# Altium footprint library LDCN Components.PcbLib: 426 footprints (part 14 of 27)
Each footprint in its own frame and in the unit in brackets; x right, y up, seen from the top. Pads: shape width x height; smd on the part's side, far side on the other; paste and mask are expansions set on the pad; w line width, h text height; cw(c..) or ccw(c..) is an arc to the next point about the centre after c.
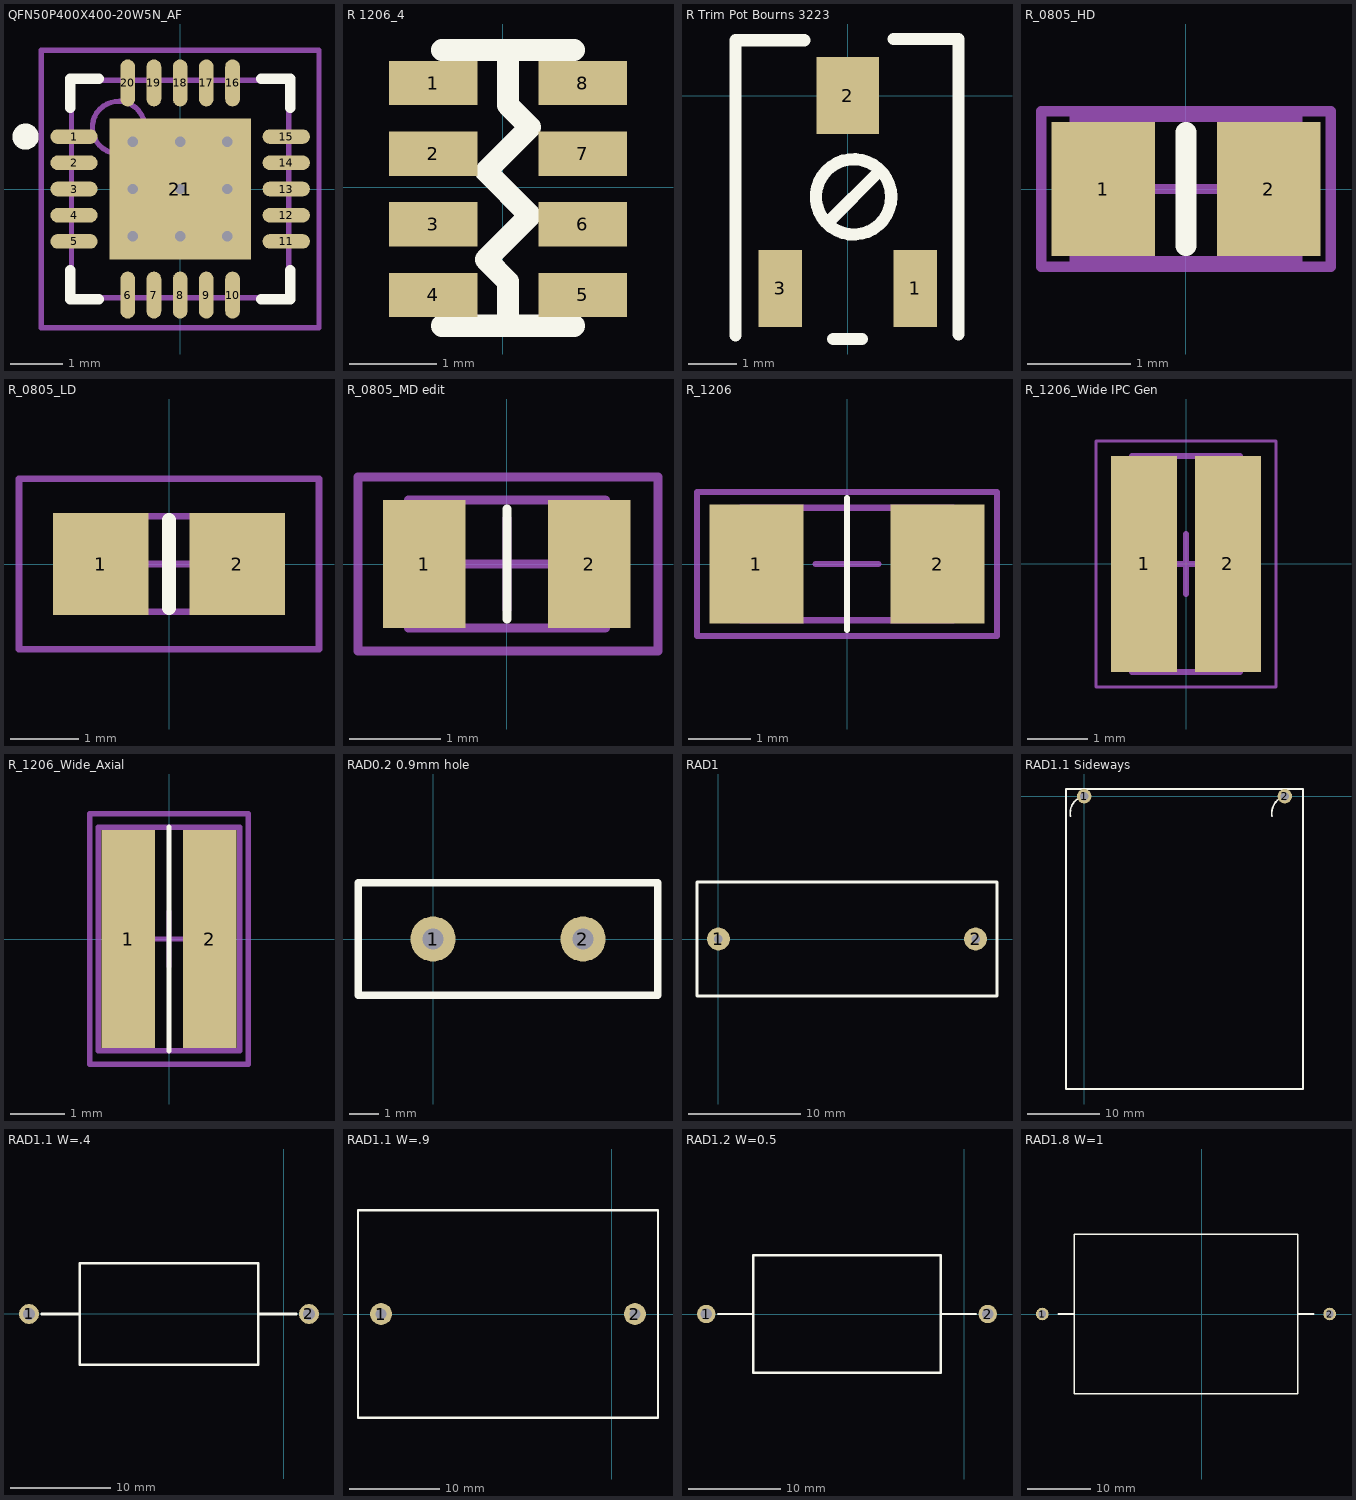
[diagram p13: the footprints below, top view; thin cyan lines are the x and y axes]

## QFN50P400X400-20W5N_AF [mm] "QFN, 20-Leads, Body 4x4mm, Pitch 0.5mm, IPC Medium Density"
height 0.8
pads (21):
  oval 0.9x0.28 smd: 1(-2.025,1) 2(-2.025,0.5) 3(-2.025,0) 4(-2.025,-0.5) 5(-2.025,-1) 11(2.025,-1) 12(2.025,-0.5) 13(2.025,0) 14(2.025,0.5) 15(2.025,1)
  oval 0.28x0.9 smd: 6(-1,-2.025) 7(-0.5,-2.025) 8(0,-2.025) 9(0.5,-2.025) 10(1,-2.025) 16(1,2.025) 17(0.5,2.025) 18(0,2.025) 19(-0.5,2.025) 20(-1,2.025)
  rect 2.7x2.7 smd: 21(0,0)
via -0.9,0.9 diameter 0.4 hole 0.2
via -0.9,0 diameter 0.4 hole 0.2
via -0.9,-0.9 diameter 0.4 hole 0.2
via 0,0.9 diameter 0.4 hole 0.2
via 0,0 diameter 0.4 hole 0.2
via 0,-0.9 diameter 0.4 hole 0.2
via 0.9,0.9 diameter 0.4 hole 0.2
via 0.9,0 diameter 0.4 hole 0.2
via 0.9,-0.9 diameter 0.4 hole 0.2
Top Overlay:
  circle w0.25: c-2.95,1 r0.125
  lines w0.2: -2.1,-1.55 -2.1,-2.1 -1.55,-2.1 ; -2.1,1.55 -2.1,2.1 -1.55,2.1 ; 1.55,-2.1 2.1,-2.1 2.1,-1.55 ; 1.55,2.1 2.1,2.1 2.1,1.55
Mechanical 13:
  circle w0.1: c-1.175,1.175 r0.5
  lines w0.1: -2.075,-2.075 2.075,-2.075 2.075,2.075 -2.075,2.075 -2.075,-2.075
Mechanical 15:
  lines w0.1: -0.5,0 0.5,0 ; 0,-0.5 0,0.5 ; -2.65,-2.65 2.65,-2.65 2.65,2.65 -2.65,2.65 -2.65,-2.65
3D body: height 0.8, standoff 0, extent -2.075,-2.075 2.075,2.075

## R 1206_4 [mil]
pads (8):
  rect 40x20 smd: 1(-31.5,47.24) 2(-31.5,15.24) 3(-31.5,-16.76) 4(-31.5,-48.76) 5(36.38,-48.76) 6(36.38,-16.76) 7(36.38,15.24) 8(36.38,47.24)
Top Overlay:
  lines w10: -27.56,-62.76 32.44,-62.76 ; -27.56,62.24 32.44,62.24 ; 2.44,-62.76 2.44,-42.76 -7.56,-32.76 12.44,-12.76 -7.56,7.24 12.44,27.24 2.44,37.24 2.44,62.24

## R Trim Pot Bourns 3223 [mm]
height 3.18
pads (3):
  rect 0.9x1.6 smd: 1(1.4,-4) 3(-1.4,-4)
  rect 1.3x1.6 smd: 2(0,0)
Top Overlay:
  circle w0.254: c0.125,-2.1 r0.781
  lines w0.254: -2.325,-4.975 -2.325,1.15 -0.9,1.15 ; -0.375,-2.6 0.625,-1.6 ; -0.3,-5.05 0.3,-5.05 ; 0.95,1.175 2.3,1.175 2.3,-4.95
3D body "3223G.stp": height 3.31, standoff 0.01, extent -1.95,-4.685 1.987,0.635

## R_0805_HD [mm] "Chip Resistor, Body 2.0x1.2mm, IPC High Density"
height 0.7
pads (2):
  rect 1x1.3 smd: 1(-0.8,0) 2(0.8,0)
Top Overlay:
  lines w0.2: 0,-0.55 0,0.55
Mechanical 13:
  lines w0.1: -1.075,-0.7 1.075,-0.7 1.075,0.7 -1.075,0.7 -1.075,-0.7
Mechanical 15:
  lines w0.1: -0.5,0 0.5,0 ; 0,-0.5 0,0.5 ; -1.4,-0.75 1.4,-0.75 1.4,0.75 -1.4,0.75 -1.4,-0.75
3D body: height 0.7, standoff 0, extent -1.075,-0.7 1.075,0.7

## R_0805_LD [mm] "Chip Resistor, Body 2.0x1.2mm, IPC Low Density"
height 0.7
pads (2):
  rect 1.4x1.5 smd: 1(-1,0) 2(1,0)
Top Overlay:
  lines w0.2: 0,-0.65 0,0.65
Mechanical 13:
  lines w0.1: -1.075,-0.7 -1.075,0.7 1.075,0.7 1.075,-0.7 -1.075,-0.7
Mechanical 15:
  lines w0.1: -0.5,0 0.5,0 ; 0,-0.5 0,0.5 ; -2.2,-1.25 -2.2,1.25 2.2,1.25 2.2,-1.25 -2.2,-1.25
3D body: height 0.7, standoff 0, extent -1.075,-0.7 1.075,0.7

## R_0805_MD edit [mm] "Chip Resistor, Body 2.0x1.2mm, IPC Medium Density"
height 0.7
pads (2):
  rect 0.9x1.4 smd: 1(-0.9,0) 2(0.9,0)
Top Overlay:
  lines w0.1: 0,-0.6 0,0.6
Mechanical 13:
  lines w0.1: -1.075,-0.7 -1.075,0.7 1.075,0.7 1.075,-0.7 -1.075,-0.7
Mechanical 15:
  lines w0.1: -0.5,0 0.5,0 ; 0,-0.5 0,0.5 ; -1.625,-0.95 -1.625,0.95 1.65,0.95 1.65,-0.95 -1.625,-0.95
3D body: height 0.7, standoff 0, extent -1.075,-0.7 1.075,0.7

## R_1206 [mm] "Chip Resistor, Body 3.2x1.6mm, IPC High Density"
height 0.65
pads (2):
  rect 1.5x1.9 smd: 1(-1.45,0) 2(1.45,0)
Top Overlay:
  lines w0.1: 0,-1.05 0,1.05
Mechanical 13:
  lines w0.1: -1.7,-0.9 1.7,-0.9 1.7,0.9 -1.7,0.9 -1.7,-0.9
Mechanical 15:
  lines w0.1: -0.5,0 0.5,0 ; 0,-0.5 0,0.5 ; -2.4,-1.15 2.4,-1.15 2.4,1.15 -2.4,1.15 -2.4,-1.15
3D body: height 1.3, standoff 0, extent -1.7,-0.9 1.7,0.9

## R_1206_Wide IPC Gen [mm] "Chip Resistor, 2-Leads, Body 1.60x3.30mm, IPC Medium Density"
height 0.6
pads (2):
  rect 1.1x3.6 smd: 1(-0.7,0) 2(0.7,0)
Mechanical 13:
  lines w0.1: -0.9,-1.8 -0.9,1.8 0.9,1.8 0.9,-1.8 -0.9,-1.8
Mechanical 15:
  lines w0.05: -1.5,-2.05 -1.5,2.05 1.5,2.05 1.5,-2.05 -1.5,-2.05
  lines w0.1: -0.5,0 0.5,0 ; 0,-0.5 0,0.5
3D body: height 0.6, standoff 0, extent -0.55,-1.8 0.55,1.8
3D body: height 0.6, standoff 0, extent -0.9,-1.8 -0.55,1.8
3D body: height 0.6, standoff 0, extent 0.55,-1.8 0.9,1.8

## R_1206_Wide_Axial [mm] "Wide 1206"
height 0.6
pads (2):
  rect 0.98x4 smd: 1(-0.75,0) 2(0.75,0)
Top Overlay:
  lines w0.1: 0,-2.05 0,2.05
Mechanical 13:
  lines w0.1: -1.3,-2.05 1.3,-2.05 1.3,-0.45 1.3,0.45 1.3,2.05 -1.3,2.05 -1.3,-2.05
Mechanical 15:
  lines w0.1: -0.5,0 0.5,0 ; 0,-0.5 0,0.5 ; -1.45,-2.3 1.45,-2.3 1.45,2.3 -1.45,2.3 -1.45,-2.3
3D body "RES_3216_SUS.step": height 0.56, standoff 0.01, extent -0.9,-1.8 0.9,1.8

## RAD0.2 0.9mm hole [mil]
height 393.7
pads (2):
  round 60 hole 28: 1(0,0) 2(200,0)
Top Overlay:
  lines w10: -100,-75 -100,75 300,75 300,-75 -100,-75

## RAD1 [mil]
pads (2):
  round 80 hole 30: 1(0,0) 2(900,0)
Top Overlay:
  lines w10: 0,-200 900,-200 ; 0,200 900,200 ; 125,-200 -75,-200 -75,200 125,200 ; 775,-200 975,-200 975,200 775,200

## RAD1.1 Sideways [mm]
height 10
pads (2):
  round 2 hole 1.2: 1(0,0) 2(27.94,0)
Top Overlay:
  lines w0.254: -1.905,-2.794 cw(c0.445,-2.349) 0,0 ; 26.162,-2.794 cw(c28.511,-2.349) 28.067,0 ; -2.54,-40.767 -2.54,1 30.48,1 30.48,-40.767 -2.54,-40.767

## RAD1.1 W=.4 [mm]
height 10
pads (2):
  round 2 hole 1.2: 1(-25.4,0) 2(2.54,0)
Top Overlay:
  lines w0.254: -24.13,0 -20.32,0 ; -2.54,0 1.27,0 ; -20.32,-5.08 -2.54,-5.08 -2.54,5.08 -20.32,5.08 -20.32,-5.08

## RAD1.1 W=.9 [mil]
height 393.7
pads (2):
  round 95 hole 47.24: 1(-1000,0) 2(100,0)
Top Overlay:
  lines w10: -1100,-450 -1100,450 200,450 200,-450 -1100,-450

## RAD1.2 W=0.5 [mm]
height 10
pads (2):
  round 2 hole 1.2: 1(-27.94,0) 2(2.54,0)
Top Overlay:
  lines w0.254: -26.67,0 -22.86,0 ; -2.54,0 1.27,0 ; -22.86,-6.35 -2.54,-6.35 -2.54,6.35 -22.86,6.35 -22.86,-6.35

## RAD1.8 W=1 [mm]
height 10
pads (2):
  round 2 hole 1.2: 1(-25.4,0) 2(20.32,0)
Top Overlay:
  lines w0.254: -22.86,0 -20.32,0 ; 15.24,0 17.78,0 ; -20.32,-12.7 15.24,-12.7 15.24,12.7 -20.32,12.7 -20.32,-12.7